# Altium footprint library lib_eps.PcbLib: 113 footprints (part 7 of 8)
Each footprint in its own frame and in the unit in brackets; x right, y up, seen from the top. Pads: shape width x height; smd on the part's side, far side on the other; paste and mask are expansions set on the pad; w line width, h text height; cw(c..) or ccw(c..) is an arc to the next point about the centre after c.
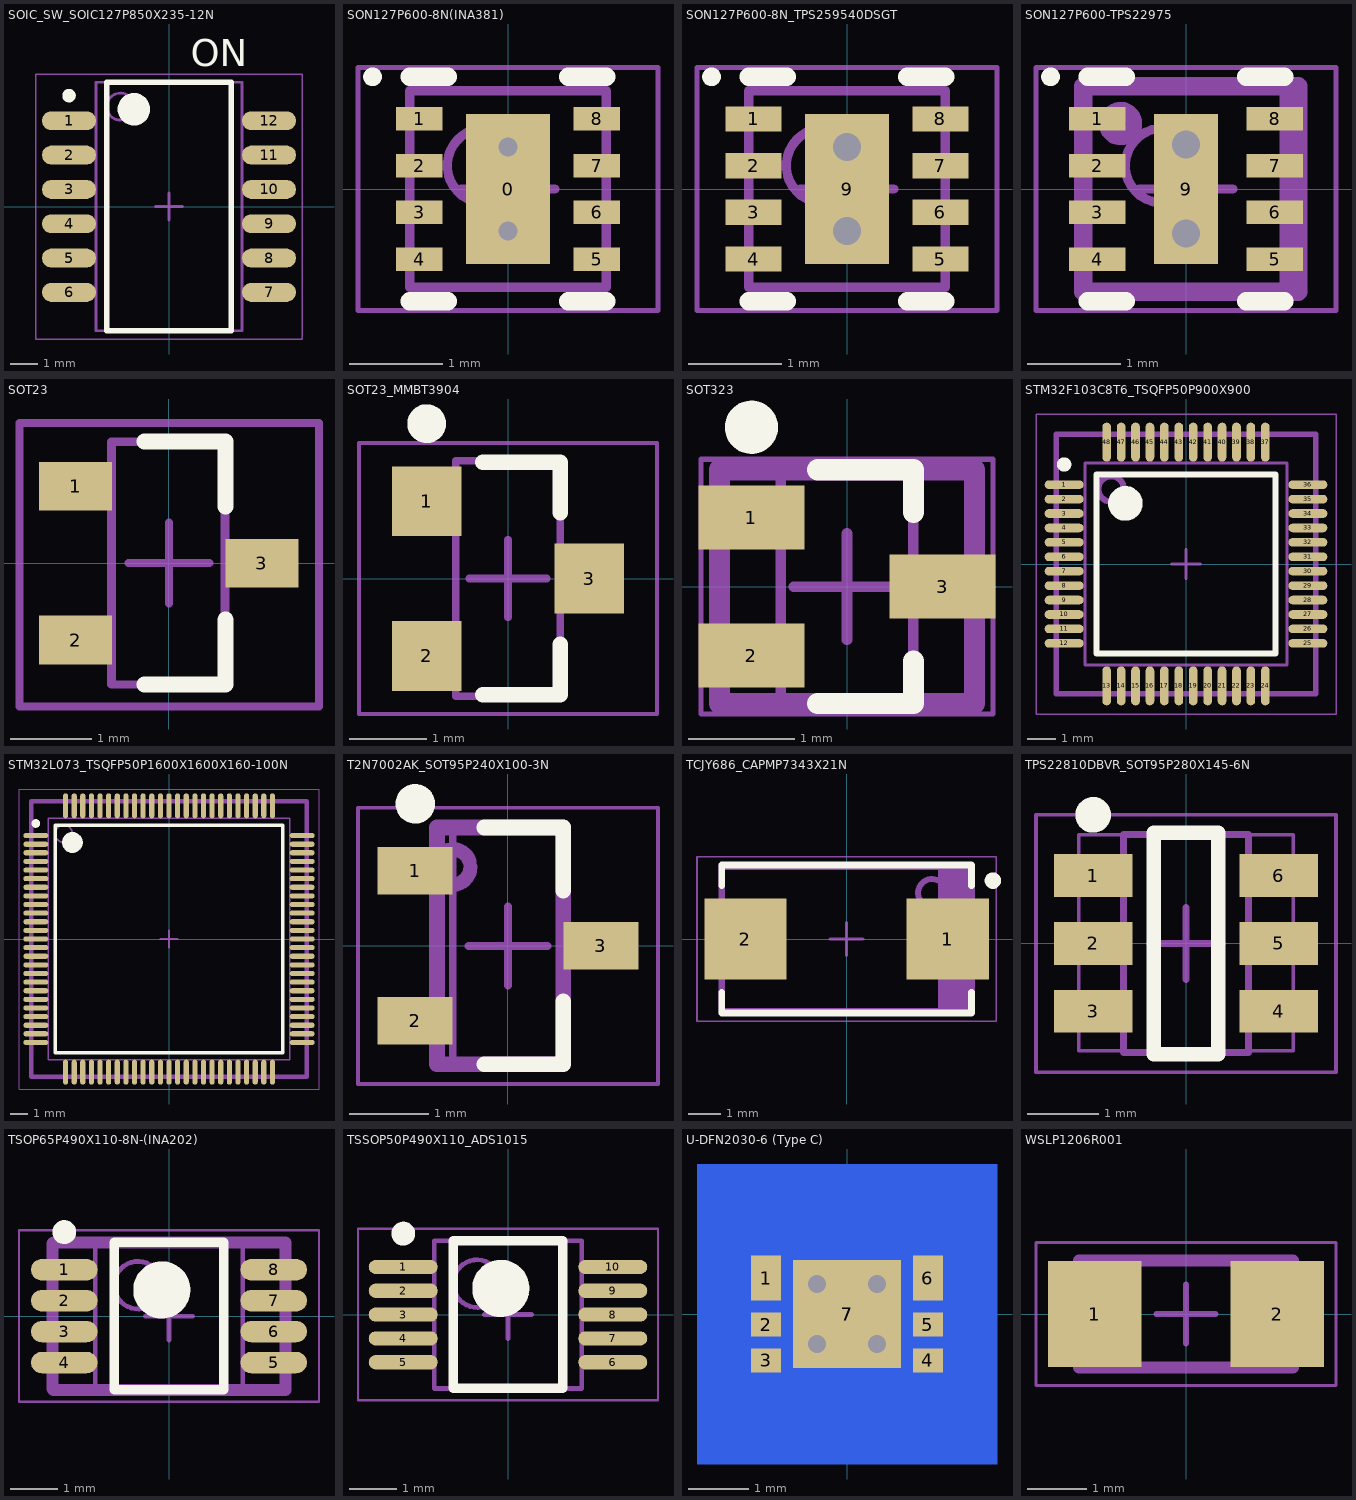
[diagram p6: the footprints below, top view; thin cyan lines are the x and y axes]

## SOIC_SW_SOIC127P850X235-12N [mm] "SOIC, 12-Leads, Body 9,22x5,35mm, Pitch 1,27mm, IPC Medium Density"
height 2.35
pads (12):
  oval 2x0.7 smd: 1(-3.7,3.175) 2(-3.7,1.905) 3(-3.7,0.635) 4(-3.7,-0.635) 5(-3.7,-1.905) 6(-3.7,-3.175) 7(3.7,-3.175) 8(3.7,-1.905) 9(3.7,-0.635) 10(3.7,0.635) 11(3.7,1.905) 12(3.7,3.175)
Top Overlay:
  circle w0.6: c-1.3,3.6 r0.3
  circle w0.25: c-3.7,4.105 r0.125
  lines w0.2: -2.3,-4.6 2.3,-4.6 2.3,4.6 -2.3,4.6 -2.3,-4.6
  text "ON" at 0.8,5.2 h1
Mechanical 13:
  circle w0.1: c-1.8,3.7 r0.5
  lines w0.1: -2.7,-4.6 2.7,-4.6 2.7,4.6 -2.7,4.6 -2.7,-4.6
Mechanical 15:
  lines w0.05: -4.925,-4.9 4.925,-4.9 4.925,4.9 -4.925,4.9 -4.925,-4.9
  lines w0.1: -0.5,0 0.5,0 ; 0,-0.5 0,0.5
3D body "A6HF_6102.step": height 2.3, standoff 0, extent -4.085,-4.375 4.035,4.375

## SON127P600-8N(INA381) [mm]
height 0.8
pads (9):
  rect 0.9x1.6 smd paste-5 mask+0.051: 0(0,0)
  rect 0.5x0.25 smd mask+0.051: 1(-0.95,0.75) 2(-0.95,0.25) 3(-0.95,-0.25) 4(-0.95,-0.75) 5(0.95,-0.75) 6(0.95,-0.25) 7(0.95,0.25) 8(0.95,0.75)
via 0,-0.45 diameter 0.51 hole 0.2
via 0,0.45 diameter 0.51 hole 0.2
Top Overlay:
  circle w0.1: c-1.45,1.2 r0.05
  lines w0.2: -1.05,-1.2 -0.645,-1.2 ; -1.05,1.2 -0.645,1.2 ; 0.645,-1.2 1.05,-1.2 ; 0.645,1.2 1.05,1.2
Top Paste:
  region: -0.4,-0.112 0.4,-0.112 0.4,-0.775 -0.4,-0.775
  region: -0.4,0.775 0.4,0.775 0.4,0.1 -0.4,0.1
Mechanical 13:
  circle w0.1: c-0.25,0.25 r0.4
  lines w0.1: -1.05,-1.05 1.05,-1.05 1.05,1.05 -1.05,1.05 -1.05,-1.05
Mechanical 15:
  lines w0.05: -1.605,-1.3 1.605,-1.3 1.605,1.3 -1.605,1.3 -1.605,-1.3
  lines w0.1: -0.5,0 0.5,0 ; 0,-0.5 0,0.5
Mechanical 29:
  lines w0.1: -1.05,-1.05 -1.05,1.05 1.05,1.05 1.05,-1.05 -1.05,-1.05
  text "'.Designator'" at -1.025,-0.375 h0.9
3D body "SON127P600-8N(INA381).step": height 0.8, standoff 0, extent -1.1,-1.05 1.1,1.05

## SON127P600-8N_TPS259540DSGT [mm]
height 0.8
pads (9):
  rect 0.6x0.27 smd mask+0.051: 1(-1,0.75) 2(-1,0.25) 3(-1,-0.25) 4(-1,-0.75) 5(1,-0.75) 6(1,-0.25) 7(1,0.25) 8(1,0.75)
  rect 0.9x1.6 smd paste-5 mask+0.051: 9(0,0)
via 0,-0.45 diameter 0.605 hole 0.3
via 0,0.45 diameter 0.605 hole 0.3
Top Overlay:
  circle w0.1: c-1.45,1.2 r0.05
  lines w0.2: -1.05,-1.2 -0.645,-1.2 ; -1.05,1.2 -0.645,1.2 ; 0.645,-1.2 1.05,-1.2 ; 0.645,1.2 1.05,1.2
Top Paste:
  region: -0.4,-0.1 0.375,-0.1 0.375,-0.775 -0.4,-0.775
  region: -0.4,0.775 0.375,0.775 0.375,0.1 -0.4,0.1
Mechanical 13:
  circle w0.1: c-0.25,0.25 r0.4
  lines w0.1: -1.05,-1.05 -1.05,1.05 1.05,1.05 1.05,-1.05 -1.05,-1.05
Mechanical 15:
  lines w0.05: -1.605,-1.3 -1.605,1.3 1.605,1.3 1.605,-1.3 -1.605,-1.3
  lines w0.1: -0.5,0 0.5,0 ; 0,-0.5 0,0.5
Mechanical 29:
  text "'.Designator'" at -1.175,-0.3 h0.6
3D body "SON127P600-8N_TPS259540DSGT.step": height 0.8, standoff 0, extent -1.1,-1.05 1.1,1.05

## SON127P600-TPS22975 [mm]
height 0.8
pads (9):
  rect 0.6x0.25 smd mask+0.051: 1(-0.95,0.75) 2(-0.95,0.25) 3(-0.95,-0.25) 4(-0.95,-0.75) 5(0.95,-0.75) 6(0.95,-0.25) 7(0.95,0.25) 8(0.95,0.75)
  rect 0.69x1.6 smd paste-5 mask+0.051: 9(0,0)
via 0,0.475 diameter 0.605 hole 0.3
via 0,-0.475 diameter 0.605 hole 0.3
Top Overlay:
  circle w0.1: c-1.45,1.2 r0.05
  lines w0.2: -1.05,-1.2 -0.645,-1.2 ; -1.05,1.2 -0.645,1.2 ; 0.645,-1.2 1.05,-1.2 ; 0.645,1.2 1.05,1.2
Top Paste:
  region: -0.325,0.125 0.325,0.125 0.325,0.8 -0.325,0.8
  region: -0.325,-0.8 0.325,-0.8 0.325,-0.125 -0.325,-0.125
Mechanical 13:
  circle w0.1: c-0.25,0.25 r0.4
  lines w0.1: -1.05,-1.05 1.05,-1.05 1.05,1.05 -1.05,1.05 -1.05,-1.05
Mechanical 15:
  lines w0.05: -1.605,-1.3 1.605,-1.3 1.605,1.3 -1.605,1.3 -1.605,-1.3
  lines w0.1: -0.5,0 0.5,0 ; 0,-0.5 0,0.5
Mechanical 29:
  circle w0.18: c-0.7,0.7 r0.141
  lines w0.2: -1.1,-1.1 -1.1,1.1 1.2,1.1 1.2,-1.1 -1.1,-1.1
  text "'.Designator'" at -0.9,-0.3 h0.6
3D body "SON127P600-TPS22975.step": height 0.8, standoff 0, extent -1.1,-1.05 1.1,1.05

## SOT23 [mm] "SOT23, 3-Leads, Body 2,90x2,30mm, Pitch 0,95mm, IPC Medium Density"
height 1.1
pads (3):
  rect 0.9x0.6 smd: 1(-1.15,0.95) 2(-1.15,-0.95) 3(1.15,0)
Top Overlay:
  lines w0.2: -0.3,-1.5 0.7,-1.5 0.7,-0.7 ; -0.3,1.5 0.7,1.5 0.7,0.7
Mechanical 13:
  lines w0.1: -0.7,-1.5 0.7,-1.5 0.7,1.5 -0.7,1.5 -0.7,-1.5
Mechanical 15:
  lines w0.05: -1.85,-1.75 1.85,-1.75 1.85,1.75 -1.85,1.75 -1.85,-1.75
  lines w0.1: -0.5,0 0.5,0 ; 0,-0.5 0,0.5
Mechanical 29:
  lines w0.1: -0.711,-1.092 -1.219,-1.092 -1.219,-0.787 -0.711,-0.787 ; -0.711,0.787 -1.219,0.787 -1.219,1.092 -0.711,1.092 ; 0.686,-0.152 1.194,-0.152 1.194,0.152 0.686,0.152 0.686,1.499 ; -0.711,1.499 0.686,1.499 ; -0.711,1.499 -0.711,-1.499 0.686,-1.499 0.686,1.499 ; -0.711,1.499 0.686,1.499 ; -1.846,-1.773 -1.846,1.727 1.854,1.727 1.854,-1.773 -1.846,-1.773
  text ".Designator" at -0.305,1.295 h0.65
3D body "SOT23.step": height 1.1, standoff 0, extent -1.25,-1.5 1.25,1.5

## SOT23_MMBT3904 [mm] "SOT23, 3-Leads, Body 2,92x2,37mm, Pitch 1,00mm, IPC Medium Density"
height 1.06
pads (3):
  rect 0.9x0.9 smd: 1(-1.05,1) 2(-1.05,-1) 3(1.05,0)
Top Overlay:
  circle w0.25: c-1.05,2 r0.125
  lines w0.2: -0.325,-1.5 0.675,-1.5 0.675,-0.85 ; -0.325,1.5 0.675,1.5 0.675,0.85
Mechanical 13:
  lines w0.1: -0.675,-1.52 0.675,-1.52 0.675,1.52 -0.675,1.52 -0.675,-1.52
Mechanical 15:
  lines w0.05: -1.925,-1.75 1.925,-1.75 1.925,1.75 -1.925,1.75 -1.925,-1.75
  lines w0.1: -0.5,0 0.5,0 ; 0,-0.5 0,0.5
3D body "SOT23_MMBT3904.step": height 1.05, standoff 0, extent -1.42,-1.52 1.42,1.52

## SOT323 [mm] "SOT23, 3-Leads, Body 2.00x2.10mm, Pitch 0.65mm, IPC High Density"
height 1
pads (3):
  rect 1x0.6 smd: 1(-0.9,0.65) 2(-0.9,-0.65) 3(0.9,0)
Top Overlay:
  circle w0.25: c-0.9,1.5 r0.125
  lines w0.2: -0.275,-1.1 0.625,-1.1 0.625,-0.7 ; -0.275,1.1 0.625,1.1 0.625,0.7
Mechanical 13:
  lines w0.1: -0.625,-1.1 -0.625,1.1 0.625,1.1 0.625,-1.1 -0.625,-1.1
Mechanical 15:
  lines w0.05: -1.375,-1.2 -1.375,1.2 1.375,1.2 1.375,-1.2 -1.375,-1.2
  lines w0.1: -0.5,0 0.5,0 ; 0,-0.5 0,0.5
Mechanical 29:
  circle w0.18: c-0.8,0.7 r0.141
  lines w0.2: -1.2,-1.1 1.2,-1.1 1.2,1.1 -1.2,1.1 -1.2,-1.1
  text "'.Designator'" at -0.9,-0.2 h0.6
3D body "SOT323.step": height 1, standoff 0, extent -1.2,-1.1 1.2,1.1

## STM32F103C8T6_TSQFP50P900X900 [mm] "TSQFP, 48-Leads, Body 7,00x7,00mm, Pitch 0,50mm, IPC Medium Density"
height 1.6
pads (48):
  oval 1.35x0.3 smd: 1(-4.225,2.75) 2(-4.225,2.25) 3(-4.225,1.75) 4(-4.225,1.25) 5(-4.225,0.75) 6(-4.225,0.25) 7(-4.225,-0.25) 8(-4.225,-0.75) 9(-4.225,-1.25) 10(-4.225,-1.75) 11(-4.225,-2.25) 12(-4.225,-2.75) 25(4.225,-2.75) 26(4.225,-2.25) 27(4.225,-1.75) 28(4.225,-1.25) 29(4.225,-0.75) 30(4.225,-0.25) 31(4.225,0.25) 32(4.225,0.75) 33(4.225,1.25) 34(4.225,1.75) 35(4.225,2.25) 36(4.225,2.75)
  oval 0.3x1.35 smd: 13(-2.75,-4.225) 14(-2.25,-4.225) 15(-1.75,-4.225) 16(-1.25,-4.225) 17(-0.75,-4.225) 18(-0.25,-4.225) 19(0.25,-4.225) 20(0.75,-4.225) 21(1.25,-4.225) 22(1.75,-4.225) 23(2.25,-4.225) 24(2.75,-4.225) 37(2.75,4.225) 38(2.25,4.225) 39(1.75,4.225) 40(1.25,4.225) 41(0.75,4.225) 42(0.25,4.225) 43(-0.25,4.225) 44(-0.75,4.225) 45(-1.25,4.225) 46(-1.75,4.225) 47(-2.25,4.225) 48(-2.75,4.225)
Top Overlay:
  circle w0.6: c-2.1,2.1 r0.3
  circle w0.25: c-4.225,3.45 r0.125
  lines w0.2: -3.1,-3.1 3.1,-3.1 3.1,3.1 -3.1,3.1 -3.1,-3.1
Mechanical 13:
  circle w0.1: c-2.6,2.6 r0.5
  lines w0.1: -3.5,-3.5 3.5,-3.5 3.5,3.5 -3.5,3.5 -3.5,-3.5
Mechanical 15:
  lines w0.05: -5.2,-5.2 5.2,-5.2 5.2,5.2 -5.2,5.2 -5.2,-5.2
  lines w0.1: -0.5,0 0.5,0 ; 0,-0.5 0,0.5
Mechanical 29:
  circle w0.18: c-2.6,2.6 r0.424
  lines w0.2: -4.5,-4.5 4.5,-4.5 4.5,4.5 -4.5,4.5 -4.5,-4.5
  text "'.Designator'" at -3.1,-0.8 h1.52
3D body "STM32F103C8T6_TSQFP50P900X900.step": height 1.6, standoff 0, extent -4.5,-4.5 4.5,4.5

## STM32L073_TSQFP50P1600X1600X160-100N [mm] "TSQFP, 100-Leads, Body 14,00x14,00mm, Pitch 0,50mm, IPC Medium Density"
height 1.6
pads (100):
  oval 1.45x0.3 smd mask+0.051: 1(-7.725,6) 2(-7.725,5.5) 3(-7.725,5) 4(-7.725,4.5) 5(-7.725,4) 6(-7.725,3.5) 7(-7.725,3) 8(-7.725,2.5) 9(-7.725,2) 10(-7.725,1.5) 11(-7.725,1) 12(-7.725,0.5) 13(-7.725,0) 14(-7.725,-0.5) 15(-7.725,-1) 16(-7.725,-1.5) 17(-7.725,-2) 18(-7.725,-2.5) 19(-7.725,-3) 20(-7.725,-3.5) 21(-7.725,-4) 22(-7.725,-4.5) 23(-7.725,-5) 24(-7.725,-5.5) 25(-7.725,-6) 51(7.725,-6) 52(7.725,-5.5) 53(7.725,-5) 54(7.725,-4.5) 55(7.725,-4) 56(7.725,-3.5) 57(7.725,-3) 58(7.725,-2.5) 59(7.725,-2) 60(7.725,-1.5) 61(7.725,-1) 62(7.725,-0.5) 63(7.725,0) 64(7.725,0.5) 65(7.725,1) 66(7.725,1.5) 67(7.725,2) 68(7.725,2.5) 69(7.725,3) 70(7.725,3.5) 71(7.725,4) 72(7.725,4.5) 73(7.725,5) 74(7.725,5.5) 75(7.725,6)
  oval 0.3x1.45 smd mask+0.051: 26(-6,-7.725) 27(-5.5,-7.725) 28(-5,-7.725) 29(-4.5,-7.725) 30(-4,-7.725) 31(-3.5,-7.725) 32(-3,-7.725) 33(-2.5,-7.725) 34(-2,-7.725) 35(-1.5,-7.725) 36(-1,-7.725) 37(-0.5,-7.725) 38(0,-7.725) 39(0.5,-7.725) 40(1,-7.725) 41(1.5,-7.725) 42(2,-7.725) 43(2.5,-7.725) 44(3,-7.725) 45(3.5,-7.725) 46(4,-7.725) 47(4.5,-7.725) 48(5,-7.725) 49(5.5,-7.725) 50(6,-7.725) 76(6,7.725) 77(5.5,7.725) 78(5,7.725) 79(4.5,7.725) 80(4,7.725) 81(3.5,7.725) 82(3,7.725) 83(2.5,7.725) 84(2,7.725) 85(1.5,7.725) 86(1,7.725) 87(0.5,7.725) 88(0,7.725) 89(-0.5,7.725) 90(-1,7.725) 91(-1.5,7.725) 92(-2,7.725) 93(-2.5,7.725) 94(-3,7.725) 95(-3.5,7.725) 96(-4,7.725) 97(-4.5,7.725) 98(-5,7.725) 99(-5.5,7.725) 100(-6,7.725)
Top Overlay:
  circle w0.6: c-5.6,5.6 r0.3
  circle w0.25: c-7.725,6.7 r0.125
  lines w0.2: -6.6,-6.6 6.6,-6.6 6.6,6.6 -6.6,6.6 -6.6,-6.6
Mechanical 13:
  circle w0.1: c-6.1,6.1 r0.5
  lines w0.1: -7,-7 7,-7 7,7 -7,7 -7,-7
Mechanical 15:
  lines w0.05: -8.7,-8.7 8.7,-8.7 8.7,8.7 -8.7,8.7 -8.7,-8.7
  lines w0.1: -0.5,0 0.5,0 ; 0,-0.5 0,0.5
Mechanical 29:
  lines w0.254: -8,-8 -8,8 8,8 8,-8 -8,-8
  text "'.Designator'" at -3.875,-0.45 h1.5
3D body "STM32L073_TSQFP50P1600X1600X160-100N.step": height 1.6, standoff 0, extent -8,-8 8,8

## T2N7002AK_SOT95P240X100-3N [mm] "SOT23, 3-Leads, Body 2,90x2,40mm, Pitch 0,95mm, IPC Medium Density"
height 1
pads (3):
  rect 0.95x0.6 smd: 1(-1.175,0.95) 2(-1.175,-0.95) 3(1.175,0)
Top Overlay:
  circle w0.25: c-1.175,1.8 r0.125
  lines w0.2: -0.3,-1.5 0.7,-1.5 0.7,-0.7 ; -0.3,1.5 0.7,1.5 0.7,0.7
Mechanical 13:
  lines w0.1: -0.7,-1.5 0.7,-1.5 0.7,1.5 -0.7,1.5 -0.7,-1.5
Mechanical 15:
  lines w0.05: -1.9,-1.75 1.9,-1.75 1.9,1.75 -1.9,1.75 -1.9,-1.75
  lines w0.1: -0.5,0 0.5,0 ; 0,-0.5 0,0.5
Mechanical 29:
  lines w0.18: -0.488,1.071 ccw(c-0.7,1) -0.476,1
  lines w0.2: -0.9,-1.5 0.7,-1.5 0.7,1.5 -0.9,1.5 -0.9,-1.5
  text "'.Designator'" at -1.2,-0.3 h0.6
3D body "T2N7002AK_SOT95P240X100-3N.step": height 1, standoff 0, extent -1.3,-1.5 1.3,1.5

## TCJY686_CAPMP7343X21N [mm] "Molded Capacitor, 2-Leads, Body 7,30x4,30mm, IPC Medium Density"
height 2.08
pads (2):
  rect 2.5x2.45 smd: 1(3.075,0) 2(-3.075,0)
Top Overlay:
  circle w0.25: c4.45,1.775 r0.125
  lines w0.2: -3.8,-1.625 -3.8,-2.25 3.8,-2.25 3.8,-1.625 ; -3.8,1.625 -3.8,2.25 3.8,2.25 3.8,1.625
Mechanical 13:
  rectangle: 2.774,-2.235 3.795,2.235
  lines w0.1: -3.795,-2.235 3.795,-2.235 3.795,2.235 -3.795,2.235 -3.795,-2.235
Mechanical 15:
  lines w0.05: -4.55,-2.5 4.55,-2.5 4.55,2.5 -4.55,2.5 -4.55,-2.5
  lines w0.1: -0.5,0 0.5,0 ; 0,-0.5 0,0.5
Mechanical 29:
  circle w0.18: c2.6,1.4 r0.424
  lines w0.2: -3.8,-2.2 3.8,-2.2 3.8,2.2 -3.8,2.2 -3.8,-2.2
  text "'.Designator'" at -3.4,-0.7 h1.52
3D body "tantalum 330uF.stp": height 2.8, standoff -0.1, extent -3.725,-2.15 3.775,2.15

## TPS22810DBVR_SOT95P280X145-6N [mm] "SOT23, 6-Leads, Body 2,90x2,80mm, Pitch 0,95mm, IPC Medium Density"
height 1.45
pads (6):
  rect 1.1x0.6 smd mask+0.051: 1(-1.3,0.95) 2(-1.3,0) 3(-1.3,-0.95) 4(1.3,-0.95) 5(1.3,0) 6(1.3,0.95)
Top Overlay:
  circle w0.25: c-1.3,1.8 r0.125
  lines w0.2: -0.45,-1.55 -0.45,1.55 0.45,1.55 0.45,-1.55 -0.45,-1.55
Mechanical 13:
  lines w0.1: -0.875,-1.525 0.875,-1.525 0.875,1.525 -0.875,1.525 -0.875,-1.525
Mechanical 15:
  lines w0.05: -2.1,-1.8 2.1,-1.8 2.1,1.8 -2.1,1.8 -2.1,-1.8
  lines w0.1: -0.5,0 0.5,0 ; 0,-0.5 0,0.5
Mechanical 29:
  lines w0.05: -1.5,-1.5 1.5,-1.5 1.5,1.525 -1.5,1.525 -1.5,-1.5
  text "'.Designator'" at 0,-1.5 h0.6
3D body "TPS22810DBVR_SOT95P280X145-6N.step": height 1.45, standoff 0, extent -1.5,-1.525 1.5,1.525

## TSOP65P490X110-8N-(INA202) [mm] "TSOP, 8-Leads, Body 3,00x3,00mm, Pitch 0,65mm, IPC Medium Density"
height 1.1
pads (8):
  oval 1.4x0.45 smd: 1(-2.2,0.975) 2(-2.2,0.325) 3(-2.2,-0.325) 4(-2.2,-0.975) 5(2.2,-0.975) 6(2.2,-0.325) 7(2.2,0.325) 8(2.2,0.975)
Top Overlay:
  circle w0.25: c-2.2,1.765 r0.125
  circle w0.6: c-0.15,0.55 r0.3
  lines w0.2: -1.15,-1.55 -1.15,1.55 1.15,1.55 1.15,-1.55 -1.15,-1.55
Mechanical 13:
  circle w0.1: c-0.65,0.65 r0.5
  lines w0.1: -1.55,-1.55 -1.55,1.55 1.55,1.55 1.55,-1.55 -1.55,-1.55
Mechanical 15:
  lines w0.05: -3.15,-1.8 -3.15,1.8 3.15,1.8 3.15,-1.8 -3.15,-1.8
  lines w0.1: -0.5,0 0.5,0 ; 0,-0.5 0,0.5
Mechanical 29:
  lines w0.254: -2.45,-1.525 -2.425,-1.55 2.45,-1.55 2.45,1.55 -2.425,1.55 -2.45,1.525 -2.45,-1.525
  text "'.Designator'" at -1.325,-0.425 h2
3D body "TSOP65P490X110-8N-(INA202).step": height 1.1, standoff 0, extent -2.45,-1.55 2.45,1.55

## TSSOP50P490X110_ADS1015 [mm] "TSSOP, 10-Leads, Body 3,00x3,00mm, Pitch 0,50mm, IPC Medium Density"
height 1.1
pads (10):
  oval 1.45x0.3 smd: 1(-2.2,1) 2(-2.2,0.5) 3(-2.2,0) 4(-2.2,-0.5) 5(-2.2,-1) 6(2.2,-1) 7(2.2,-0.5) 8(2.2,0) 9(2.2,0.5) 10(2.2,1)
Top Overlay:
  circle w0.25: c-2.2,1.7 r0.125
  circle w0.6: c-0.15,0.55 r0.3
  lines w0.2: -1.15,-1.55 -1.15,1.55 1.15,1.55 1.15,-1.55 -1.15,-1.55
Mechanical 13:
  circle w0.1: c-0.65,0.65 r0.5
  lines w0.1: -1.55,-1.55 -1.55,1.55 1.55,1.55 1.55,-1.55 -1.55,-1.55
Mechanical 15:
  lines w0.05: -3.15,-1.8 -3.15,1.8 3.15,1.8 3.15,-1.8 -3.15,-1.8
  lines w0.1: -0.5,0 0.5,0 ; 0,-0.5 0,0.5
3D body "TSSOP50P490X110_ADS1015.step": height 1.1, standoff 0, extent -2.45,-1.55 2.45,1.55

## U-DFN2030-6 (Type C) [mm] "IC BATT PROTECTION LI-ION 6UDFN"
pads (8):
  rect 0.5x0.75 smd mask+0.051: 1(-1.35,0.6) 6(1.35,0.6)
  rect 0.5x0.4 smd mask+0.051: 2(-1.35,-0.175) 3(-1.35,-0.775) 4(1.35,-0.775) 5(1.35,-0.175)
  rect 1.8x1.8 smd mask+0.051: 7(0,0)
  rect 5x5 smd far side mask+0.051: 7(0,0)
via -0.5,0.5 diameter 0.605 hole 0.3
via 0.5,0.5 diameter 0.605 hole 0.3
via 0.5,-0.5 diameter 0.605 hole 0.3
via -0.5,-0.5 diameter 0.605 hole 0.3
Top Overlay:
  circle w0.18: c-2.2,1 r0.141
  lines w0.2: -1.6,-1.3 -1.1,-1.3 ; -1.6,1.4 -1.1,1.4 ; 1.1,-1.3 1.6,-1.3 ; 1.1,1.4 1.6,1.4
Mechanical 29:
  lines w0.18: -0.8,0.7 ccw(c-0.9,0.6) -0.774,0.663
  lines w0.2: -1.5,-0.9 1.5,-0.9 1.5,1 -1.5,1 -1.5,-0.9
  text "'.Designator'" at -0.975,-0.2 h0.6
3D body: height 0.6, standoff 0, extent -1.5,-1 1.5,1

## WSLP1206R001 [mm] "Chip Resistor, 2-Leads, Body 3,20x1,60mm, IPC Medium Density"
height 0.89
pads (2):
  rect 1.57x1.78 smd: 1(-1.538,0) 2(1.538,0)
Mechanical 13:
  lines w0.1: -1.73,-0.925 1.73,-0.925 1.73,0.925 -1.73,0.925 -1.73,-0.925
Mechanical 15:
  lines w0.05: -2.525,-1.2 2.525,-1.2 2.525,-0.425 2.525,0.425 2.525,1.2 -2.525,1.2 -2.525,0.425 -2.525,-0.425 -2.525,-1.2
  lines w0.1: -0.5,0 0.5,0 ; 0,-0.5 0,0.5
Mechanical 29:
  lines w0.2: -1.8,-0.9 1.8,-0.9 1.8,0.9 -1.8,0.9 -1.8,-0.9
  text "'.Designator'" at -1.4,-0.3 h0.6
3D body "WSLP1206R001.step": height 0.89, standoff 0, extent -1.73,-0.925 1.73,0.925